# Altium footprint library MODULE_MISC.PcbLib: 22 footprints (part 2 of 2)
Each footprint in its own frame and in the unit in brackets; x right, y up, seen from the top. Pads: shape width x height; smd on the part's side, far side on the other; paste and mask are expansions set on the pad; w line width, h text height; cw(c..) or ccw(c..) is an arc to the next point about the centre after c.
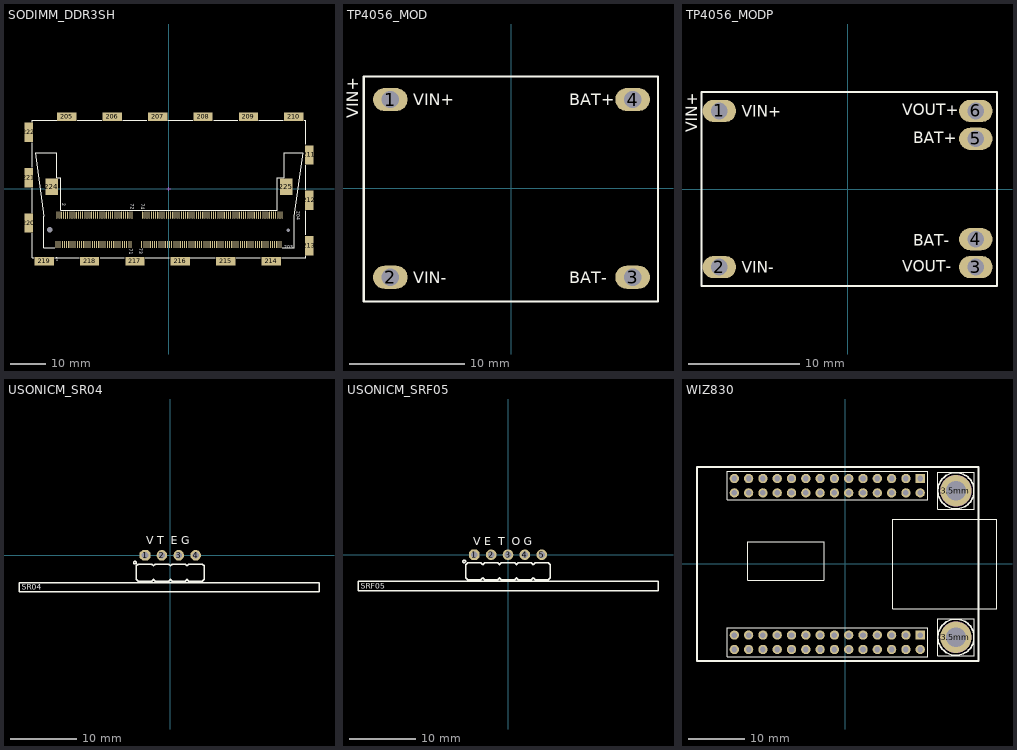
[diagram p1: the footprints below, top view; thin cyan lines are the x and y axes]

## SODIMM_DDR3SH [mm] "SO-DIMM, 204pin, DDR3, SHIELDED"
pads (226):
  oval 0.3x2 smd mask+0.05: 1(-31.588,-15.562) 2(-31.288,-7.362) 3(-30.988,-15.562) 4(-30.688,-7.362) 5(-30.388,-15.562) 6(-30.088,-7.362) 7(-29.788,-15.562) 8(-29.488,-7.362) 9(-29.188,-15.562) 10(-28.888,-7.362) 11(-28.588,-15.562) 12(-28.288,-7.362) 13(-27.988,-15.562) 14(-27.688,-7.362) 15(-27.388,-15.562) 16(-27.088,-7.362) 17(-26.788,-15.562) 18(-26.488,-7.362) 19(-26.188,-15.562) 20(-25.888,-7.362) 21(-25.588,-15.562) 22(-25.288,-7.362) 23(-24.988,-15.562) 24(-24.688,-7.362) 25(-24.388,-15.562) 26(-24.088,-7.362) 27(-23.788,-15.562) 28(-23.488,-7.362) 29(-23.188,-15.562) 30(-22.888,-7.362) 31(-22.588,-15.562) 32(-22.288,-7.362) 33(-21.988,-15.562) 34(-21.688,-7.362) 35(-21.388,-15.562) 36(-21.088,-7.362) 37(-20.788,-15.562) 38(-20.488,-7.362) 39(-20.188,-15.562) 40(-19.888,-7.362) 41(-19.588,-15.562) 42(-19.288,-7.362) 43(-18.988,-15.562) 44(-18.688,-7.362) 45(-18.388,-15.562) 46(-18.088,-7.362) 47(-17.788,-15.562) 48(-17.488,-7.362) 49(-17.188,-15.562) 50(-16.888,-7.362) 51(-16.588,-15.562) 52(-16.288,-7.362) 53(-15.988,-15.562) 54(-15.688,-7.362) 55(-15.388,-15.562) 56(-15.088,-7.362) 57(-14.788,-15.562) 58(-14.488,-7.362) 59(-14.188,-15.562) 60(-13.888,-7.362) 61(-13.588,-15.562) 62(-13.288,-7.362) 63(-12.988,-15.562) 64(-12.688,-7.362) 65(-12.388,-15.562) 66(-12.088,-7.362) 67(-11.788,-15.562) 68(-11.488,-7.362) 69(-11.188,-15.562) 70(-10.888,-7.362) 71(-10.588,-15.562) 72(-10.288,-7.362) 73(-7.588,-15.562) 74(-7.288,-7.362) 75(-6.988,-15.562) 76(-6.688,-7.362) 77(-6.388,-15.562) 78(-6.088,-7.362) 79(-5.788,-15.562) 80(-5.488,-7.362) 81(-5.188,-15.562) 82(-4.888,-7.362) 83(-4.588,-15.562) 84(-4.288,-7.362) 85(-3.988,-15.562) 86(-3.688,-7.362) 87(-3.388,-15.562) 88(-3.088,-7.362) 89(-2.788,-15.562) 90(-2.488,-7.362) 91(-2.188,-15.562) 92(-1.888,-7.362) 93(-1.588,-15.562) 94(-1.288,-7.362) 95(-0.988,-15.562) 96(-0.688,-7.362) 97(-0.388,-15.562) 98(-0.088,-7.362) 99(0.212,-15.562) 100(0.512,-7.362) 101(0.812,-15.562) 102(1.112,-7.362) 103(1.412,-15.562) 104(1.712,-7.362) 105(2.012,-15.562) 106(2.312,-7.362) 107(2.612,-15.562) 108(2.912,-7.362) 109(3.212,-15.562) 110(3.512,-7.362) 111(3.812,-15.562) 112(4.112,-7.362) 113(4.412,-15.562) 114(4.712,-7.362) 115(5.012,-15.562) 116(5.312,-7.362) 117(5.612,-15.562) 118(5.912,-7.362) 119(6.212,-15.562) 120(6.512,-7.362) 121(6.812,-15.562) 122(7.112,-7.362) 123(7.412,-15.562) 124(7.712,-7.362) 125(8.012,-15.562) 126(8.312,-7.362) 127(8.612,-15.562) 128(8.912,-7.362) 129(9.212,-15.562) 130(9.512,-7.362) 131(9.812,-15.562) 132(10.112,-7.362) 133(10.412,-15.562) 134(10.712,-7.362) 135(11.012,-15.562) 136(11.312,-7.362) 137(11.612,-15.562) 138(11.912,-7.362) 139(12.212,-15.562) 140(12.512,-7.362) 141(12.812,-15.562) 142(13.112,-7.362) 143(13.412,-15.562) 144(13.712,-7.362) 145(14.012,-15.562) 146(14.312,-7.362) 147(14.612,-15.562) 148(14.912,-7.362) 149(15.212,-15.562) 150(15.512,-7.362) 151(15.812,-15.562) 152(16.112,-7.362) 153(16.412,-15.562) 154(16.712,-7.362) 155(17.012,-15.562) 156(17.312,-7.362) 157(17.612,-15.562) 158(17.912,-7.362) 159(18.212,-15.562) 160(18.512,-7.362) 161(18.812,-15.562) 162(19.112,-7.362) 163(19.412,-15.562) 164(19.712,-7.362) 165(20.012,-15.562) 166(20.312,-7.362) 167(20.612,-15.562) 168(20.912,-7.362) 169(21.212,-15.562) 170(21.512,-7.362) 171(21.812,-15.562) 172(22.112,-7.362) 173(22.412,-15.562) 174(22.712,-7.362) 175(23.012,-15.562) 176(23.312,-7.362) 177(23.612,-15.562) 178(23.912,-7.362) 179(24.212,-15.562) 180(24.512,-7.362) 181(24.812,-15.562) 182(25.112,-7.362) 183(25.412,-15.562) 184(25.712,-7.362) 185(26.012,-15.562) 186(26.312,-7.362) 187(26.612,-15.562) 188(26.912,-7.362) 189(27.212,-15.562) 190(27.512,-7.362) 191(27.812,-15.562) 192(28.112,-7.362) 193(28.412,-15.562) 194(28.712,-7.362) 195(29.012,-15.562) 196(29.312,-7.362) 197(29.612,-15.562) 198(29.912,-7.362) 199(30.212,-15.562) 200(30.512,-7.362) 201(30.812,-15.562) 202(31.112,-7.362) 203(31.412,-15.562) 204(31.712,-7.362)
  rect 5.4x2.4 smd mask+0.1: 205(-28.513,20.182) 206(-15.813,20.182) 207(-3.113,20.182) 208(9.587,20.182) 209(22.287,20.182) 210(34.987,20.182) 214(28.637,-20.255) 215(15.937,-20.255) 216(3.237,-20.255) 217(-9.463,-20.255) 218(-22.163,-20.255) 219(-34.863,-20.255)
  rect 2.4x5.4 smd mask+0.1: 211(39.33,9.488) 212(39.33,-3.212) 213(39.33,-15.912) 220(-39.206,-9.562) 221(-39.206,3.138) 222(-39.206,15.838)
  rect 3.6x4.6 smd: 224(-32.738,0.538) 225(32.862,0.538)
  round 0 hole 1.6 unplated: " "(-33.338,-11.462)
  round 0 hole 1 unplated: " "(33.462,-11.562)
Top Overlay:
  lines w0.152: -38.19,-12.478 -38.19,-19.239 -37.84,-19.239 ; -38.19,-6.788 -38.19,0.121 ; -38.19,6.013 -38.19,12.922 ; -38.19,18.612 -38.19,19.166 -31.337,19.166 ; -31.948,-16.462 -34.988,-16.462 -34.988,-7.662 -37.388,10.038 -31.388,10.038 -31.388,3.173 -30.175,3.173 -30.175,-6.044 30.294,-6.044 30.294,3.148 32.123,3.148 32.114,10.038 37.612,10.038 35.112,-7.662 35.112,-16.462 31.763,-16.462 ; -31.947,-19.239 -25.038,-19.239 ; -25.648,19.166 -18.739,19.166 ; -19.145,-19.239 -12.44,-19.239 ; -12.846,19.166 -6.14,19.166 ; -6.547,-19.239 0.159,-19.239 ; -0.248,19.166 6.661,19.166 ; 6.052,-19.239 12.96,-19.239 ; 12.554,19.166 19.26,19.166 ; 18.853,-19.239 25.559,-19.239 ; 25.152,19.166 32.061,19.166 ; 31.655,-19.239 38.314,-19.239 38.314,-18.777 ; 37.954,19.166 38.314,19.166 38.314,12.516 ; 38.314,-12.884 38.314,-6.179 ; 38.314,-0.286 38.314,6.623
  text "2" at -29.861,-4.066 h0.89
  text "72" at -10.684,-4.218 h0.89
  text "74" at -7.763,-4.218 h0.89
  text "204" at 35.756,-6.276 h0.89
  text "1" at -31.639,-20.068 h0.89
  text "71" at -11.065,-16.791 h0.89
  text "73" at -8.271,-16.664 h0.89
  text "203" at 32.242,-16.732 h0.89
Mechanical 1:
  lines w0.2: -0.5,0 0.5,0 ; 0,-0.5 0,0.5
Multi-Layer:
  pour cut-out: -33.338,-10.262 -33.456,-10.262 -33.688,-10.308 -33.906,-10.398 -34.103,-10.53 -34.27,-10.697 -34.401,-10.893 -34.492,-11.112 -34.538,-11.344 -34.538,-11.462 -34.538,-11.58 -34.492,-11.812 -34.401,-12.03 -34.27,-12.227 -34.103,-12.394 -33.906,-12.525 -33.688,-12.616 -33.456,-12.662 -33.338,-12.662 -33.22,-12.662 -32.988,-12.616 -32.77,-12.525 -32.573,-12.394 -32.406,-12.227 -32.275,-12.03 -32.184,-11.812 -32.138,-11.58 -32.138,-11.462 -32.138,-11.344 -32.184,-11.112 -32.275,-10.893 -32.406,-10.697 -32.573,-10.53 -32.77,-10.398 -32.988,-10.308 -33.22,-10.262
  pour cut-out: 33.462,-10.562 33.364,-10.562 33.17,-10.6 32.988,-10.676 32.825,-10.785 32.685,-10.924 32.576,-11.088 32.5,-11.27 32.462,-11.463 32.462,-11.562 32.462,-11.66 32.5,-11.853 32.576,-12.035 32.685,-12.199 32.825,-12.339 32.988,-12.448 33.17,-12.523 33.364,-12.562 33.462,-12.562 33.56,-12.562 33.754,-12.523 33.936,-12.448 34.099,-12.339 34.239,-12.199 34.348,-12.035 34.424,-11.853 34.462,-11.66 34.462,-11.562 34.462,-11.463 34.424,-11.27 34.348,-11.088 34.239,-10.924 34.099,-10.785 33.936,-10.676 33.754,-10.6 33.56,-10.562
3D body "JEDEC DDR3 204P SODIMM (1_5V).step": height 5.4, standoff 1.6, extent -33.75,-11.55 33.85,18.45
3D body "sodimm204.step": height 5.55, standoff -0.6, extent -35.75,-16.55 35.85,9.99

## TP4056_MOD [mm] "TP4056 MODULE"
pads (4):
  oval 3x2 hole 1.5: 1(-10.5,7.7) 2(-10.5,-7.7) 3(10.5,-7.7) 4(10.5,7.7)
Top Overlay:
  lines w0.2: -12.8,-9.8 -12.8,9.7 12.7,9.7 12.7,-9.8 -12.8,-9.8
  text "BAT+" at 5,7.2 h1
  text "BAT-" at 5,-8.2 h1
  text "VIN-" at -8.5,-8.2 h1
  text "VIN+" at -8.5,7.2 h1
  text "VIN+" at -13.3,6.1 h1
3D body "Lipo Charger - TP4056.stp": height 5.52, standoff 0, extent -13.871,-9.588 12.573,9.589

## TP4056_MODP [mm] "TP4056 MODULE+"
pads (6):
  oval 3x2 hole 1.5: 1(-11.5,7) 2(-11.5,-7) 3(11.5,-7) 4(11.5,-4.5) 5(11.5,4.5) 6(11.5,7)
Top Overlay:
  lines w0.2: -13.1,-8.7 -13.1,8.7 13.4,8.7 13.4,-8.7 -13.1,-8.7
  text "VIN+" at -13.5,5.1 h1
  text "VOUT-" at 4.9,-7.4 h1
  text "VOUT+" at 4.9,6.6 h1
  text "BAT-" at 5.9,-5.1 h1
  text "BAT+" at 5.9,4.1 h1
  text "VIN+" at -9.5,6.5 h1
  text "VIN-" at -9.5,-7.5 h1
3D body "TP4056.STEP": height 5.95, standoff 0.29, extent -13.246,-8.6 13.246,8.545

## USONICM_SR04 [mm] "Ultrasonic sensor Module, HC-SR04"
pads (4):
  oct 1.6x1.6 / inner oct 1.6x1.6 / far side oct 1.6x2.2 hole 1 mask+0.1: 1(-3.81,0)
  round 1.6 / inner round 1.6 / far side oval 1.6x2.2 hole 1 mask+0.1: 2(-1.27,0) 3(1.27,0) 4(3.81,0)
Top Overlay:
  circle w0.2: c-5.33,-1.1 r0.2
  lines w0.2: -2.57,-3.6 -2.27,-3.9 -0.27,-3.9 0.03,-3.6 ; -2.57,-1.6 -2.27,-1.3 -0.27,-1.3 0.03,-1.6 ; -2.51,-3.6 -2.81,-3.9 -4.81,-3.9 -5.11,-3.6 -5.11,-1.6 -4.81,-1.3 -2.81,-1.3 -2.51,-1.6 ; -0.03,-3.6 0.27,-3.9 2.27,-3.9 2.57,-3.6 ; -0.03,-1.6 0.27,-1.3 2.27,-1.3 2.57,-1.6 ; 2.51,-3.6 2.81,-3.9 4.81,-3.9 ; 2.51,-1.6 2.81,-1.3 4.81,-1.3 ; 4.81,-3.9 5.11,-3.6 ; 4.81,-3.9 5.11,-3.6 ; 4.81,-1.3 5.11,-1.6 ; 4.81,-1.3 5.11,-1.6 ; 5.11,-3.6 5.11,-1.6 ; -22.8,-5.5 -22.8,-4.1 22.4,-4.1 22.4,-5.5 -22.8,-5.5
  text "SR04" at -22.4,-5.2 h0.8
  text "V T  E G" at -3.63,1.7 h1.2
3D body "HC-SR04_User Library.STEP": height 20.6, standoff -4.58, extent -22.7,-17.8 22.3,0.268

## USONICM_SRF05 [mm] "Ultrasonic sensor Module, SRF05"
pads (5):
  oct 1.6x1.6 / inner oct 1.6x1.6 / far side oct 1.6x2.2 hole 1 mask+0.1: 1(-5.08,0)
  round 1.6 / inner round 1.6 / far side oval 1.6x2.2 hole 1 mask+0.1: 2(-2.54,0) 3(0,0) 4(2.54,0) 5(5.08,0)
Top Overlay:
  circle w0.2: c-6.6,-1 r0.2
  lines w0.2: -3.84,-3.5 -3.54,-3.8 -1.54,-3.8 -1.24,-3.5 ; -3.84,-1.5 -3.54,-1.2 -1.54,-1.2 -1.24,-1.5 ; -3.78,-3.5 -4.08,-3.8 -6.08,-3.8 -6.38,-3.5 -6.38,-1.5 -6.08,-1.2 -4.08,-1.2 -3.78,-1.5 ; -1.3,-3.5 -1,-3.8 1,-3.8 1.3,-3.5 ; -1.3,-1.5 -1,-1.2 1,-1.2 1.3,-1.5 ; 1.24,-3.5 1.54,-3.8 3.54,-3.8 3.84,-3.5 ; 1.24,-1.5 1.54,-1.2 3.54,-1.2 3.84,-1.5 ; 3.78,-3.5 4.08,-3.8 6.08,-3.8 6.38,-3.5 6.38,-1.5 6.08,-1.2 4.08,-1.2 3.78,-1.5 ; -22.6,-5.4 -22.6,-4 22.6,-4 22.6,-5.4 -22.6,-5.4
  text "V E  T  O G" at -5.2,1.4 h1.2
  text "SRF05" at -22.2,-5.1 h0.8
3D body "HY-SRF05_v3.stp": height 20.3, standoff -6.3, extent -22.5,-17.7 22.5,0.327

## WIZ830 [mil]
pads (58):
  round 220.47 hole 137.8: 3.5mm(775,-512.3) 3.5mm(775,512.1)
  rect 65x65 hole 39.37: J1-1(525,597.7) J2-1(525,-497.3)
  round 65 hole 39.37: J1-2(525,497.3) J1-3(425,597.7) J1-4(425,497.3) J1-5(325,597.7) J1-6(325,497.3) J1-7(225,597.7) J1-8(225,497.3) J1-9(125,597.7) J1-10(125,497.3) J1-11(25,597.7) J1-12(25,497.3) J1-13(-75,597.7) J1-14(-75,497.3) J1-15(-175,597.7) J1-16(-175,497.3) J1-17(-275,597.7) J1-18(-275,497.3) J1-19(-375,597.7) J1-20(-375,497.3) J1-21(-475,597.7) J1-22(-475,497.3) J1-23(-575,597.7) J1-24(-575,497.3) J1-25(-675,597.7) J1-26(-675,497.3) J1-27(-775,597.7) J1-28(-775,497.3) J2-2(525,-597.7) J2-3(425,-497.3) J2-4(425,-597.7) J2-5(325,-497.3) J2-6(325,-597.7) J2-7(225,-497.3) J2-8(225,-597.7) J2-9(125,-497.3) J2-10(125,-597.7) J2-11(25,-497.3) J2-12(25,-597.7) J2-13(-75,-497.3) J2-14(-75,-597.7) J2-15(-175,-497.3) J2-16(-175,-597.7) J2-17(-275,-497.3) J2-18(-275,-597.7) J2-19(-375,-497.3) J2-20(-375,-597.7) J2-21(-475,-497.3) J2-22(-475,-597.7) J2-23(-575,-497.3) J2-24(-575,-597.7) J2-25(-675,-497.3) J2-26(-675,-597.7) J2-27(-775,-497.3) J2-28(-775,-597.7)
Top Overlay:
  circle w10: c775,-512.3 r125.98
  circle w5: c774.52,-512.27 r59.06
  circle w5: c774.52,511.35 r59.06
  circle w10: c775,512.1 r125.98
  lines w5: -682.17,-113.57 -682.17,157.02 -150.68,157.02 -150.68,-113.57 -682.17,-113.57 ; 333.57,-313.45 1061.92,-313.45 1061.92,312.54 333.57,312.54 333.57,-313.45
  lines w7.87: -823.4,-647.3 576.6,-647.3 576.6,-447.3 -823.4,-447.3 -823.4,-647.3 ; -823.4,447.7 -823.4,647.7 576.6,647.7 576.6,447.7 -823.4,447.7 ; 647,-640.3 647,-384.3 903,-384.3 903,-640.3 647,-640.3 ; 647,384.1 903,384.1 903,640.1 647,640.1 647,384.1
  lines w11.81: -1036,-679.04 -1036,678.84 932,678.84 932,-679.04 -1036,-679.04
Keep-Out Layer:
  circle w39.37: c775,512.1 r78.74
Mechanical 7:
  circle w3.94: c775,512.18 r106.3
  circle w47.24: c775,512.1 r86.61
  circle w3.94: c775,-512.38 r106.3
  region: 755.28,575.09 711.97,575.09 711.97,543.59 755.28,543.59
  region: 743.49,531.76 743.49,575.07 712,575.07 712,531.76
  region: 733.03,565.85 721.22,554.04 743.49,531.76 755.3,543.58
  region: 837.98,531.76 837.98,575.07 806.48,575.07 806.48,531.76
  rectangle: 794.67,543.57 837.98,575.06
  region: 828.73,554.05 816.92,565.86 794.65,543.59 806.46,531.78
  rectangle: 794.67,449.09 837.98,480.58
  region: 816.9,458.3 828.71,470.11 806.44,492.38 794.63,480.57
  region: 712,492.39 712,449.09 743.49,449.09 743.49,492.39
  region: 755.3,480.58 712,480.58 712,449.09 755.3,449.09
  region: 721.22,470.14 733.03,458.33 755.3,480.6 743.49,492.41
  region: 743.47,-492.63 755.29,-480.82 733.01,-458.55 721.2,-470.36
  region: 755.31,-449.31 712,-449.31 712,-480.81 755.31,-480.81
  region: 743.49,-492.61 743.49,-449.31 712,-449.31 712,-492.61
  region: 794.65,-480.8 806.46,-492.61 828.73,-470.34 816.92,-458.53
  rectangle: 794.67,-480.82 837.98,-449.32
  region: 806.48,-531.99 794.67,-543.8 816.94,-566.07 828.75,-554.26
  rectangle: 794.67,-575.29 837.98,-543.8
  region: 806.48,-531.99 806.48,-575.3 837.98,-575.3 837.98,-531.99
  region: 755.31,-543.8 743.5,-531.99 721.23,-554.26 733.04,-566.07
  region: 712,-531.98 712,-575.29 743.49,-575.29 743.49,-531.98
  region: 755.3,-543.79 712,-543.79 712,-575.29 755.3,-575.29